# Altium footprint library Conectores GAM.PcbLib: 182 footprints (part 6 of 12)
Each footprint in its own frame and in the unit in brackets; x right, y up, seen from the top. Pads: shape width x height; smd on the part's side, far side on the other; paste and mask are expansions set on the pad; w line width, h text height; cw(c..) or ccw(c..) is an arc to the next point about the centre after c.
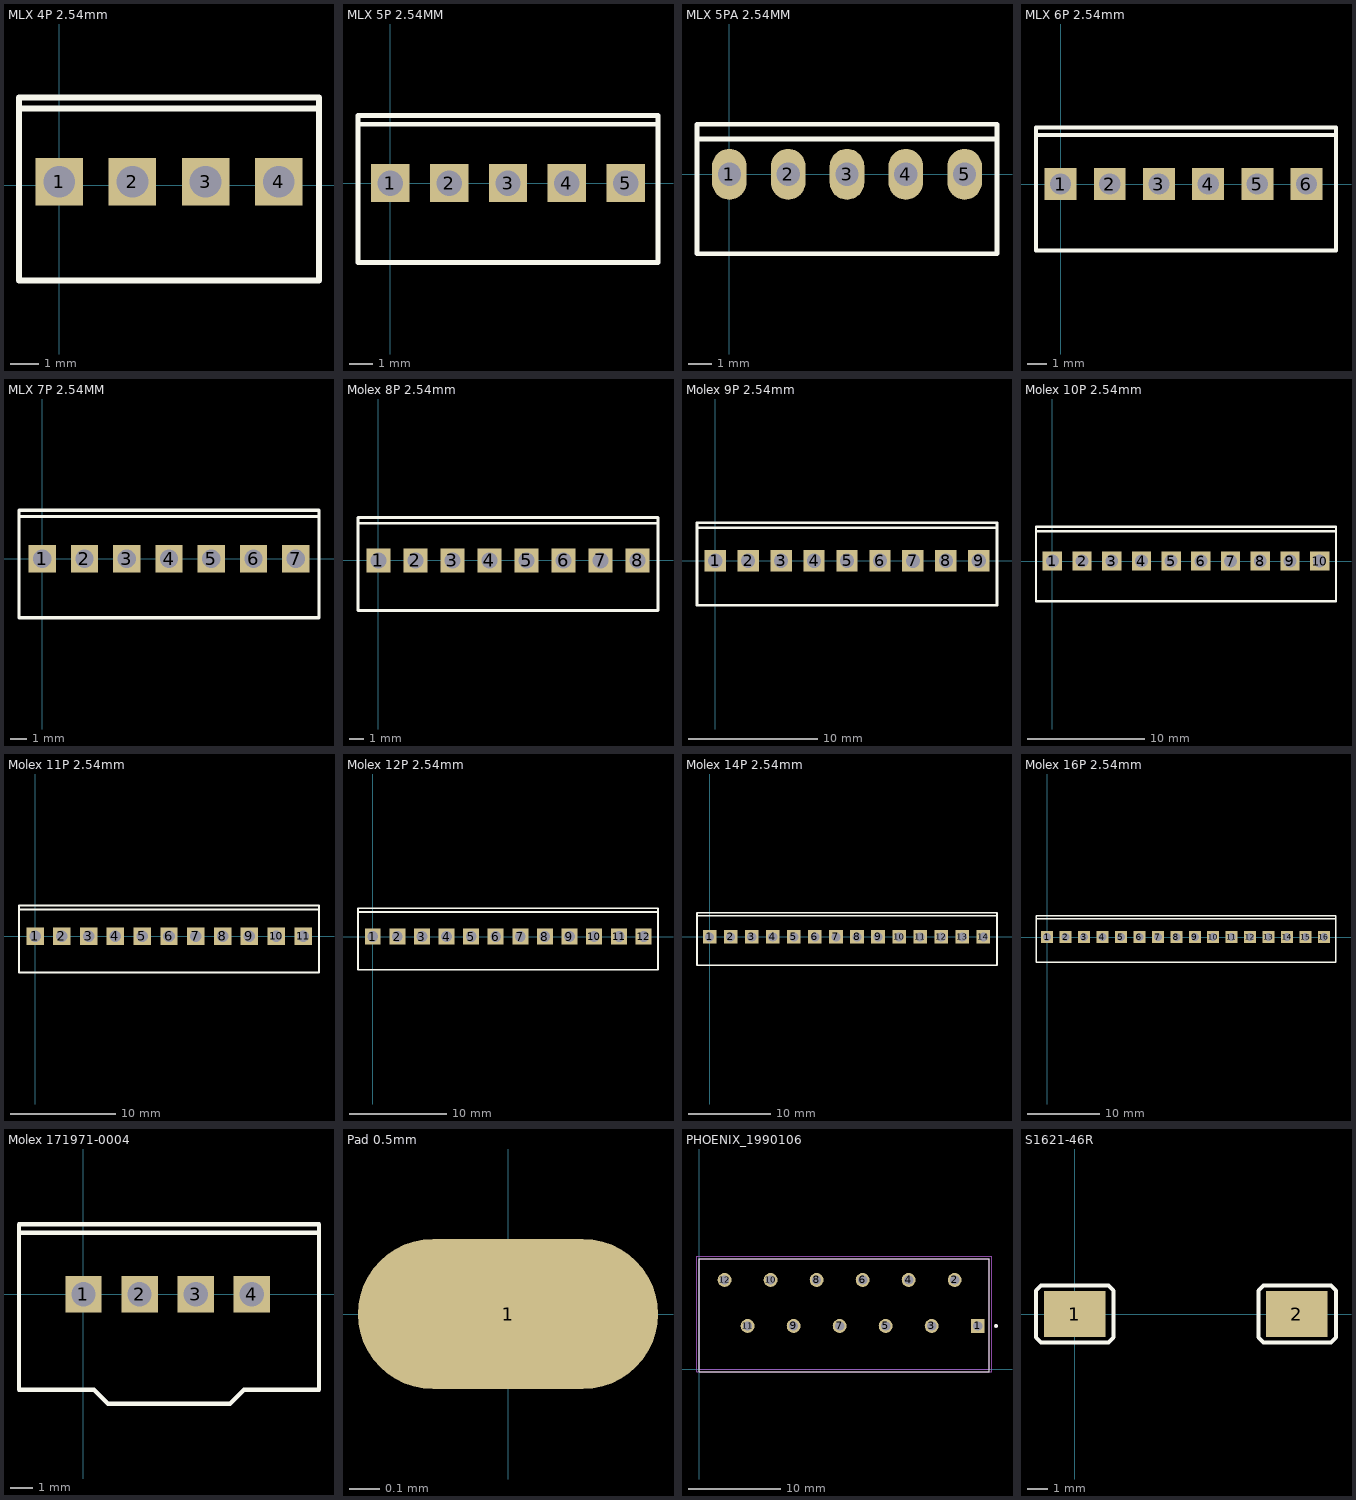
[diagram p5: the footprints below, top view; thin cyan lines are the x and y axes]

## MLX 4P 2.54mm [mm]
pads (4):
  rect 1.65x1.65 hole 1.1: 1(0,0.127) 2(2.54,0.127) 3(5.08,0.127) 4(7.62,0.127)
Top Overlay:
  lines w0.2: -1.27,2.667 8.89,2.667 ; -1.397,-3.302 -1.397,3.048 9.017,3.048 9.017,-3.302 -1.397,-3.302
3D body "MOLEX 4X1.step": height 12.23, standoff -2.05, extent -1.27,-3.073 8.89,2.827

## MLX 5P 2.54MM [mm]
pads (5):
  rect 1.65x1.65 hole 1.1: 1(0,0) 2(2.54,0) 3(5.08,0) 4(7.62,0) 5(10.16,0)
Top Overlay:
  lines w0.2: -1.27,2.54 11.557,2.54 ; -1.397,-3.429 -1.397,2.921 11.557,2.921 11.557,-3.429 -1.397,-3.429
3D body "MLX5PR.step": height 11.76, standoff -3.04, extent -1.27,-3.302 11.43,2.498

## MLX 5PA 2.54MM [mm] "Molex Connector 90 Deg conection"
pads (5):
  oval 1.5x2.2 hole 1: 1(0,0) 2(2.54,0) 3(5.08,0) 4(7.62,0) 5(10.16,0)
Top Overlay:
  lines w0.2: -1.397,1.524 11.43,1.524 ; -1.397,-3.429 -1.397,2.159 11.557,2.159 11.557,-3.429 -1.397,-3.429
3D body "WF-5R1.step": height 6.05, standoff -3.15, extent -1.27,-11.211 11.43,0.289

## MLX 6P 2.54mm [mm]
pads (6):
  rect 1.65x1.65 hole 1.1: 1(0,0) 2(2.54,0) 3(5.08,0) 4(7.62,0) 5(10.16,0) 6(12.7,0)
Top Overlay:
  lines w0.2: -1.27,2.54 14.097,2.54 ; -1.27,-3.429 14.224,-3.429 14.224,2.921 -1.27,2.921 -1.27,-3.429
3D body "MLX6PR.step": height 11.76, standoff -3.04, extent -1.143,-3.302 14.097,2.498

## MLX 7P 2.54MM [mm]
pads (7):
  rect 1.65x1.65 hole 1.1: 1(0,0) 2(2.54,0) 3(5.08,0) 4(7.62,0) 5(10.16,0) 6(12.7,0) 7(15.24,0)
Top Overlay:
  lines w0.2: -1.27,2.54 16.637,2.54 ; -1.397,-3.556 -1.397,2.921 16.637,2.921 16.637,-3.556 -1.397,-3.556
3D body "MLX7PR.step": height 11.76, standoff -3.04, extent -1.27,-3.406 16.51,2.394

## Molex 8P 2.54mm [mm]
pads (8):
  rect 1.65x1.65 hole 1.1: 1(0,0) 2(2.54,0) 3(5.08,0) 4(7.62,0) 5(10.16,0) 6(12.7,0) 7(15.24,0) 8(17.78,0)
Top Overlay:
  lines w0.2: -1.27,2.54 19.177,2.54 ; -1.397,-3.429 -1.397,2.921 19.177,2.921 19.177,-3.429 -1.397,-3.429
3D body "MLX8PR.step": height 11.76, standoff -3.04, extent -1.27,-3.302 19.05,2.498

## Molex 9P 2.54mm [mm] "Conector Tipo Molex 9P"
pads (9):
  rect 1.65x1.65 hole 1.1: 1(0,0) 2(2.54,0) 3(5.08,0) 4(7.62,0) 5(10.16,0) 6(12.7,0) 7(15.24,0) 8(17.78,0) 9(20.32,0)
Top Overlay:
  lines w0.2: -1.27,2.54 21.717,2.54 ; -1.397,-3.429 -1.397,2.921 21.717,2.921 21.717,-3.429 -1.397,-3.429
3D body "MLX9PR.step": height 11.76, standoff -3.04, extent -1.27,-3.302 21.59,2.498

## Molex 10P 2.54mm [mm] "Conector Tipo Molex 10P"
pads (10):
  rect 1.65x1.65 hole 1.1: 1(0,0) 2(2.54,0) 3(5.08,0) 4(7.62,0) 5(10.16,0) 6(12.7,0) 7(15.24,0) 8(17.78,0) 9(20.32,0) 10(22.86,0)
Top Overlay:
  lines w0.2: -1.27,2.54 24.13,2.54 ; -1.397,-3.429 -1.397,2.921 24.257,2.921 24.257,-3.429 -1.397,-3.429
3D body "MLX10PR.step": height 11.76, standoff -3.04, extent -1.27,-3.302 24.13,2.498

## Molex 11P 2.54mm [mm] "Conector Tipo Molex 11P"
pads (11):
  rect 1.65x1.65 hole 1.1: 1(0,0) 2(2.54,0) 3(5.08,0) 4(7.62,0) 5(10.16,0) 6(12.7,0) 7(15.24,0) 8(17.78,0) 9(20.32,0) 10(22.86,0) 11(25.445,0.002)
Top Overlay:
  lines w0.2: -1.524,2.54 26.797,2.54 ; -1.524,-3.429 26.924,-3.429 26.924,2.921 -1.524,2.921 -1.524,-3.429
3D body "2510-11.step": height 11.55, standoff -3.15, extent -1.27,-3.133 26.67,2.667

## Molex 12P 2.54mm [mm] "Conector Tipo Molex 12P"
pads (12):
  rect 1.65x1.65 hole 1.1: 1(0,0) 2(2.54,0) 3(5.08,0) 4(7.62,0) 5(10.16,0) 6(12.7,0) 7(15.24,0) 8(17.78,0) 9(20.32,0) 10(22.86,0) 11(25.445,0.002) 12(27.985,0.002)
Top Overlay:
  lines w0.2: -1.524,2.54 29.464,2.54 ; -1.524,-3.429 -1.524,2.921 29.464,2.921 29.464,-3.429 -1.524,-3.429
3D body "2510-12P.step": height 11.55, standoff -3.15, extent -1.27,-3.133 29.21,2.667

## Molex 14P 2.54mm [mm] "Conector Tipo Molex 14P"
pads (14):
  rect 1.65x1.65 hole 1.1: 1(0,0) 2(2.54,0) 3(5.08,0) 4(7.62,0) 5(10.16,0) 6(12.7,0) 7(15.24,0) 8(17.78,0) 9(20.32,0) 10(22.86,0) 11(25.4,0) 12(27.94,0) 13(30.48,0) 14(33.02,0)
Top Overlay:
  lines w0.2: -1.524,2.54 34.671,2.54 ; -1.524,-3.429 -1.524,2.921 34.671,2.921 34.671,-3.429 -1.524,-3.429
3D body "WF-14.step": height 11.55, standoff -3.15, extent -1.27,-3.133 34.29,2.667

## Molex 16P 2.54mm [mm] "Conector Tipo Molex 16P"
pads (16):
  rect 1.65x1.65 hole 1.1: 1(0,0) 2(2.54,0) 3(5.08,0) 4(7.62,0) 5(10.16,0) 6(12.7,0) 7(15.24,0) 8(17.78,0) 9(20.32,0) 10(22.86,0) 11(25.4,0) 12(27.94,0) 13(30.48,0) 14(33.02,0) 15(35.56,0) 16(38.1,0)
Top Overlay:
  lines w0.2: -1.524,2.54 39.751,2.54 ; -1.524,-3.429 -1.524,2.921 39.751,2.921 39.751,-3.429 -1.524,-3.429
3D body "WF-16.step": height 11.55, standoff -3.15, extent -1.27,-3.257 39.37,2.543

## Molex 171971-0004 [mm] "Header Macho 171971-0004 Polaridad"
pads (4):
  rect 1.65x1.65 hole 1.1: 1(0,0) 2(2.54,0) 3(5.08,0) 4(7.62,0)
Top Overlay:
  lines w0.2: -2.921,2.794 10.668,2.794 ; -2.921,-4.318 0.476,-4.318 1.111,-4.953 6.636,-4.953 7.271,-4.318 10.668,-4.318 10.668,3.175 -2.921,3.175 -2.921,-4.318
3D body: height 11, standoff -3, extent 7.176,-0.444 8.065,0.445
3D body: height 11, standoff -3, extent 4.636,-0.444 5.525,0.445
3D body: height 11, standoff -3, extent 2.096,-0.444 2.985,0.445
3D body: height 11, standoff -3, extent -0.444,-0.444 0.445,0.445
3D body "1719710004.stp": height 12, standoff -3.11, extent -2.5,-4.05 10.12,2.55

## Pad 0.5mm [mm] "Pad 0.5mm x 1mm"
pads (1):
  oval 1x0.5 smd: 1(0,0)

## PHOENIX_1990106 [mm]
pads (12):
  rect 1.508x1.508 / inner round 1.508 / far side rect 1.508x1.508 hole 1: 1(30.25,4.7)
  round 1.508 hole 1: 2(27.75,9.7) 3(25.25,4.7) 4(22.75,9.7) 5(20.25,4.7) 6(17.75,9.7) 7(15.25,4.7) 8(12.75,9.7) 9(10.25,4.7) 10(7.75,9.7) 11(5.25,4.7) 12(2.75,9.7)
Top Overlay:
  circle w0.2: c32.247,4.7 r0.1
  lines w0.127: 0,-0.254 31.5,-0.254 31.5,12 0,12 0,-0.254
Mechanical 13:
  circle w0.2: c32.247,4.7 r0.1
  lines w0.127: 0,0 0,12 31.5,12 31.5,0 0,0
Mechanical 15:
  lines w0.05: -0.25,-0.25 31.75,-0.25 31.75,12.25 -0.25,12.25 -0.25,-0.25
3D body "1990106.step": height 14.1, standoff -2.5, extent -0.002,0.082 31.498,12.083

## S1621-46R [mm] "Jumper SMT"
pads (2):
  rect 3x2.25 smd: 1(0,0) 2(10.9,0)
Top Overlay:
  lines w0.2: -1.905,-1.143 -1.651,-1.397 1.651,-1.397 1.905,-1.143 1.905,1.143 1.651,1.397 -1.651,1.397 -1.905,1.143 -1.905,-1.143 ; 9.017,-1.143 9.017,1.143 9.271,1.397 12.573,1.397 12.827,1.143 12.827,-1.143 12.573,-1.397 9.271,-1.397 9.017,-1.143
3D body "s1621-46r.stp": height 1.8, standoff 0, extent -0.508,-1.15 11.792,1.15